# Altium footprint library Connector.PcbLib: 230 footprints (part 12 of 15)
Each footprint in its own frame and in the unit in brackets; x right, y up, seen from the top. Pads: shape width x height; smd on the part's side, far side on the other; paste and mask are expansions set on the pad; w line width, h text height; cw(c..) or ccw(c..) is an arc to the next point about the centre after c.
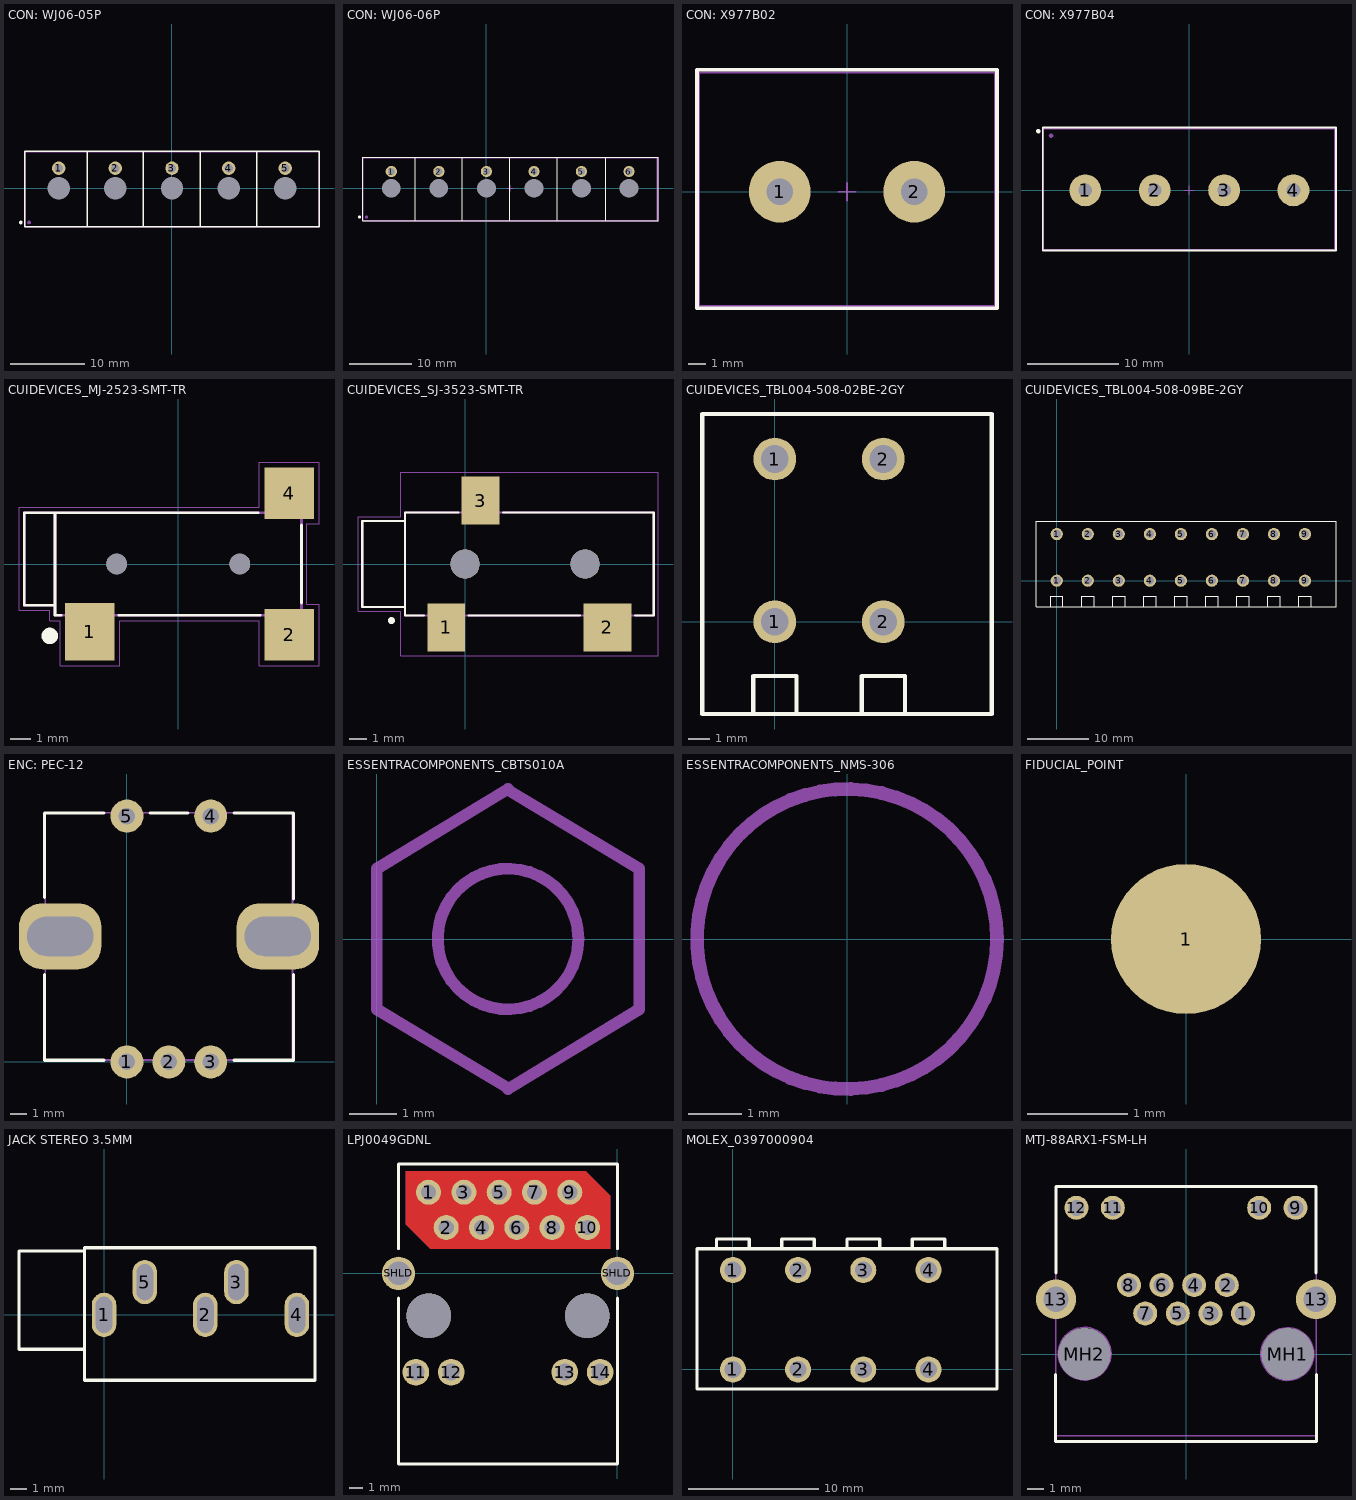
[diagram p11: the footprints below, top view; thin cyan lines are the x and y axes]

## CON: WJ06-05P [mm]
pads (12):
  round 1.8 hole 1.1: 1(-15.24,2.7) 2(-7.62,2.7) 3(0,2.7) 4(7.63,2.7) 5(15.23,2.7)
  round 0.5 on Top Overlay: ""(-20.33,-4.6)
  round 0.5 on Mech1: ""(-19.23,-4.6)
  round 2.4 hole 3: ""(-15.24,0) ""(-7.62,0) ""(0,0) ""(7.62,0) ""(15.24,0)
Top Overlay:
  lines w0.2: -11.43,-5.2 -11.43,5 ; -3.03,-5.2 -19.83,-5.2 -19.83,5 -3.03,5 ; 3.78,-5.2 3.78,5 ; 11.38,-5.2 11.38,5 ; -3.87,-5.2 19.78,-5.2 19.78,5 -3.87,5 -3.87,-5.2
TopAssy:
  lines w0.1: -19.74,-5.08 19.78,-5.08 19.78,4.92 -19.74,4.92 -19.74,-5.08
Border:
  lines w0.1: -8.12,0 -7.12,0 ; -7.62,-0.5 -7.62,0.5 ; -19.83,-5.175 -19.83,5 19.78,5 19.78,-5.175 -19.83,-5.175
3D body "Connector 5pin.STEP": height 6.12, standoff 0.04, extent -19.74,-5.08 19.74,4.972

## CON: WJ06-06P [mm]
pads (14):
  round 1.8 hole 1.1: 1(-15.24,2.7) 2(-7.62,2.7) 3(0,2.7) 4(7.63,2.7) 5(15.23,2.7) 6(22.85,2.7)
  round 0.5 on Top Overlay: ""(-20.33,-4.6)
  round 0.5 on Mech1: ""(-19.23,-4.6)
  round 2.4 hole 3: ""(-15.24,0) ""(-7.62,0) ""(0,0) ""(7.62,0) ""(15.24,0) ""(22.86,0)
Top Overlay:
  lines w0.2: -11.43,-5.2 -11.43,5 ; -3.03,-5.2 -19.83,-5.2 -19.83,5 -3.03,5 ; 3.78,-5.2 3.78,5 ; 11.38,-5.2 11.38,5 ; 19.1,-5.2 19.1,5 ; -3.87,-5.2 27.5,-5.2 27.5,5 -3.87,5 -3.87,-5.2
TopAssy:
  lines w0.1: -19.74,-5.08 27.4,-5.08 27.4,4.92 -19.74,4.92 -19.74,-5.08
Border:
  lines w0.1: 3.3,0 4.3,0 ; 3.8,-0.5 3.8,0.5 ; -19.83,-5.175 -19.83,5 27.5,5 27.5,-5.175 -19.83,-5.175
3D body "Разъем 6 выводов.STEP": height 6.17, standoff 0.17, extent -19.74,-5.08 27.36,4.92

## CON: X977B02 [mm]
pads (2):
  round 3.5 hole 1.5: 1(-3.81,0) 2(3.81,0)
Top Overlay:
  lines w0.2: -8.5,-6.6 -8.5,6.9 8.5,6.9 8.5,-6.6 -8.5,-6.6
TopAssy:
  lines w0.1: -8.37,-6.484 -8.37,6.75 8.37,6.75 8.37,-6.484 -8.37,-6.484
Border:
  lines w0.1: -0.5,0 0.5,0 ; 0,-0.5 0,0.5 ; -8.5,-6.6 -8.5,6.9 8.5,6.9 8.5,-6.6 -8.5,-6.6
3D body "User Library-DG25C-1.STEP": height 14.8, standoff -4.79, extent -8.37,-6.484 8.37,6.75

## CON: X977B04 [mm]
pads (6):
  round 3.5 hole 1.5: 1(-11.43,0) 2(-3.81,0) 3(3.81,0) 4(11.43,0)
  round 0.5 on Top Overlay: ""(-16.6,6.5)
  round 0.5 on Mech1: ""(-15.2,6)
Top Overlay:
  lines w0.2: -16.1,-6.6 16.1,-6.6 16.1,6.9 -16.1,6.9 -16.1,-6.6
TopAssy:
  lines w0.1: -15.99,6.75 15.99,6.75 15.99,-6.484 -15.99,-6.484 -15.99,6.75 ; -15.99,6.75 -15.99,6.75
Border:
  lines w0.1: -0.5,0 0.5,0 ; 0,-0.5 0,0.5 ; -16.1,-6.6 16.1,-6.6 16.1,6.85 -16.1,6.85 -16.1,-6.6
3D body "User Library-DG25C-1.STEP": height 14.8, standoff -4.79, extent -15.99,-6.484 0.75,6.75
3D body "User Library-DG25C-1.STEP": height 14.8, standoff -4.79, extent -0.75,-6.484 15.99,6.75

## CUIDEVICES_MJ-2523-SMT-TR [mm] "CONN JACK MONO 2.5MM SMD R/A"
pads (5):
  rect 2.4x2.8 smd: 1(-4.3,-3.3)
  rect 2.4x2.5 smd: 2(5.4,-3.45) 4(5.4,3.45)
  round 1 hole 1 unplated: ""(-3,0) ""(3,0)
Top Overlay:
  circle w0.4: c-6.25,-3.5 r0.2
  lines w0.127: -5.7,-2.5 -6,-2.5 -6,-2 ; -2.9,-2.5 4,-2.5 ; 3.9,2.5 -6,2.5 ; 6,-1.9 6,1.9 ; -6,-2 -7.5,-2 -7.5,2.5 -6,2.5 ; -6,-2 -6,2.5
Border:
  lines w0.05: -7.75,-2.25 -6.25,-2.25 -6.25,-2.75 -5.75,-2.75 -5.75,-4.95 -2.85,-4.95 -2.85,-2.75 3.95,-2.75 3.95,-4.95 6.85,-4.95 6.85,-1.95 6.25,-1.95 6.25,1.95 6.85,1.95 6.85,4.95 3.95,4.95 3.95,2.75 -7.75,2.75 -7.75,-2.25
3D:
  circle w0.4: c-4.5,-4 r0.2
  lines w0.127: -6,-2 -7.5,-2 -7.5,2.5 -6,2.5 ; -6,-2 -6,-2.5 6,-2.5 6,2.5 -6,2.5 ; -6,-2 -6,2.5
3D body "CUI_DEVICES_MJ-2523-SMT-TR.step": height 4.7, standoff -0.6, extent -7.5,-3.75 6,4.25

## CUIDEVICES_SJ-3523-SMT-TR [mm] "CONN JACK STEREO 3.5MM SMD R/A"
pads (5):
  rect 2.2x2.8 smd: 1(-1.1,-3.7) 3(0.9,3.7)
  rect 2.8x2.8 smd: 2(8.3,-3.7)
  round 1.7 hole 1.7 unplated: ""(0,0) ""(7,0)
Top Overlay:
  circle w0.2: c-4.3,-3.3 r0.1
  lines w0.127: -2.4,-3 -3.5,-3 -3.5,-2.5 ; -0.4,3 -3.5,3 -3.5,2.5 ; 0.2,-3 6.7,-3 ; 2.2,3 11,3 11,-3 9.9,-3 ; -3.5,-2.5 -6,-2.5 -6,2.5 -3.5,2.5 ; -3.5,-2.5 -3.5,2.5
Border:
  lines w0.05: -6.25,-2.75 -6.25,2.75 -3.75,2.75 -3.75,5.35 11.25,5.35 11.25,-5.35 -3.75,-5.35 -3.75,-2.75 -6.25,-2.75
3D:
  circle w0.2: c-4.3,-3.3 r0.1
  lines w0.127: -3.5,-2.5 -6,-2.5 -6,2.5 -3.5,2.5 ; -3.5,-3 11,-3 11,3 -3.5,3 -3.5,-3
3D body "CUI_DEVICES_SJ-3523-SMT-TR.step": height 5, standoff -0.8, extent -5.96,-4.555 11.04,4.445

## CUIDEVICES_TBL004-508-02BE-2GY [mm] "TERMINAL BLOCK, SCREWLESS, 5.08"
pads (4):
  round 2 hole 1.3: 1(0,0) 1(0,7.62) 2(5.08,0) 2(5.08,7.62)
Top Overlay:
  lines w0.2: -1.016,-4.267 -1.016,-2.54 1.016,-2.54 1.016,-4.267 ; 4.064,-4.267 4.064,-2.54 6.096,-2.54 6.096,-4.267 ; 10.16,-4.318 -3.404,-4.318 -3.404,-1.524 -3.404,0 -3.404,9.144 -3.404,9.728 -3.378,9.728 0,9.728 10.16,9.728 ; 10.16,-4.267 10.16,9.652
3D body "gorizont.STEP": height 12.6, standoff -3.6, extent -3.14,-4.1 1.94,9.5
3D body "gorizont.STEP": height 12.6, standoff -3.6, extent 2.02,-4.1 7.1,9.5

## CUIDEVICES_TBL004-508-09BE-2GY [mm] "TERMINAL BLOCK, SCREWLESS, 5.08"
pads (18):
  round 2 hole 1.3: 1(0,0) 1(0,7.62) 2(5.08,0) 2(5.08,7.62) 3(10.16,0) 3(10.16,7.62) 4(15.24,0) 4(15.24,7.62) 5(20.32,0) 5(20.32,7.62) 6(25.4,0) 6(25.4,7.62) 7(30.48,0) 7(30.48,7.62) 8(35.56,0) 8(35.56,7.62) 9(40.64,0) 9(40.64,7.62)
Top Overlay:
  lines w0.2: -1.016,-4.267 -1.016,-2.54 1.016,-2.54 1.016,-4.267 ; 4.064,-4.267 4.064,-2.54 6.096,-2.54 6.096,-4.267 ; 9.144,-4.267 9.144,-2.54 11.176,-2.54 11.176,-4.267 ; 14.224,-4.267 14.224,-2.54 16.256,-2.54 16.256,-4.267 ; 19.304,-4.267 19.304,-2.54 21.336,-2.54 21.336,-4.267 ; 24.384,-4.267 24.384,-2.54 26.416,-2.54 26.416,-4.267 ; 29.464,-4.267 29.464,-2.54 31.496,-2.54 31.496,-4.267 ; 34.544,-4.267 34.544,-2.54 36.576,-2.54 36.576,-4.267 ; 39.624,-4.267 39.624,-2.54 41.656,-2.54 41.656,-4.267 ; 45.72,-1.524 45.72,9.144 45.72,9.728 ; 45.72,9.728 45.72,-4.267 42.24,-4.267 -3.404,-4.267 -3.404,-1.524 -3.404,0 -3.404,9.144 -3.404,9.728 -3.378,9.728 0,9.728 45.72,9.728
3D body: height 13.3, standoff 10.4, extent 1.25,-1.13 2.25,8.12
3D body: height 13.3, standoff 10.4, extent -2.5,-5.13 2.25,4.12
3D body: height 13.3, standoff 10.4, extent 6.33,-1.13 7.33,8.12
3D body: height 13.3, standoff 10.4, extent 2.58,-5.13 7.33,4.12
3D body: height 13.3, standoff 10.4, extent 11.41,-1.13 12.41,8.12
3D body: height 13.3, standoff 10.4, extent 7.66,-5.13 12.41,4.12
3D body: height 13.3, standoff 10.4, extent 16.49,-1.13 17.49,8.12
3D body: height 13.3, standoff 10.4, extent 12.74,-5.13 17.49,4.12
3D body: height 13.3, standoff 10.4, extent 21.57,-1.13 22.57,8.12
3D body: height 13.3, standoff 10.4, extent 17.82,-5.13 22.57,4.12
3D body: height 13.3, standoff 10.4, extent 26.65,-1.13 27.65,8.12
3D body: height 13.3, standoff 10.4, extent 22.9,-5.13 27.65,4.12
3D body: height 13.3, standoff 10.4, extent 31.73,-1.13 32.73,8.12
3D body: height 13.3, standoff 10.4, extent 27.98,-5.13 32.73,4.12
3D body: height 13.3, standoff 10.4, extent 36.81,-1.13 37.81,8.12
3D body: height 13.3, standoff 10.4, extent 33.06,-5.13 37.81,4.12
3D body: height 13.3, standoff 10.4, extent 41.89,-1.13 42.89,8.12
3D body: height 13.3, standoff 10.4, extent 38.14,-5.13 42.89,4.12
3D body: height 10.4, standoff 0, extent -3.4,-4.3 45.7,9.7

## ENC: PEC-12 [mm]
pads (7):
  round 2 hole 1: 1(0,0) 2(2.54,0) 3(5.08,0) 4(5.08,14.922) 5(0,14.922)
  rrect70% 5x4 hole 2.4 slot 4 at 0 deg: ""(-4.05,7.625) ""(9.15,7.625)
Top Overlay:
  lines w0.2: -5,5.3 -5,0.1 -1.4,0.1 ; -5,10 -5,15.1 -1.4,15.1 ; 1.4,15.1 3.7,15.1 ; 6.5,0.1 10.1,0.1 10.1,5.3 ; 6.5,15.1 10.1,15.1 10.1,9.9
TopAssy:
  lines w0.1: -4.966,0.12 -4.966,15.12 10.046,15.12 10.046,0.12 -4.966,0.12
3D body "User Library-rotacijski enkoder.STEP": height 16.5, standoff -4.53, extent -4.964,0.12 10.044,15.12

## ESSENTRACOMPONENTS_CBTS010A [mm] "HEX STANDOFF M3 NYLON 5MM"
3D:
  circle w0.254: c2.8,0 r1.5
  lines w0.254: 2.8,-3.2 5.6,-1.5 5.6,0 5.6,1.5 2.8,3.176 ; 2.8,-3.176 0,-1.5 0,0 0,1.5 2.8,3.2
3D body: height 0.25, standoff -173.75, extent 0,1.5 0,1.5
3D body: height 5, standoff 0, extent 0,-3.2 5.6,3.2

## ESSENTRACOMPONENTS_NMS-306 [mm] "MACH SCREW PAN HEAD PHILLIPS M3"
height 2.5
3D:
  circle w0.254: c0,0 r2.8
3D body "NMS-306.stp": height 2.5, standoff -6.4, extent -2.85,-2.85 2.85,2.85

## FIDUCIAL_POINT [mm]
pads (1):
  round 1.5 all layers, no hole paste+3 mask+1: 1(0,0)
Multi-Layer:
  circle w0.254: c0,0 r1.5

## JACK STEREO 3.5MM [mm]
height 12.3
pads (5):
  oval 1.5x2.7 hole 2.2 slot 1 at 0 deg: 1(0,0) 2(6.2,0) 3(8.1,2) 4(11.8,0) 5(2.5,2)
Top Overlay:
  lines w0.2: -1.2,-2.1 -5.2,-2.1 -5.2,3.9 -1.2,3.9 ; -1.2,-4 -1.2,4.1 12.9,4.1 12.9,-4 -1.2,-4
3D body "User Library-ST-215N-03.STEP": height 12.3, standoff -3.5, extent -5.325,-4 12.775,4.1

## LPJ0049GDNL [mm]
height 13.3
pads (16):
  round 1.8 hole 1.1: 1(-13.59,5.842) 2(-12.32,3.302) 3(-11.05,5.842) 4(-9.78,3.302) 5(-8.51,5.842) 6(-7.24,3.302) 7(-5.97,5.842) 8(-4.7,3.302) 9(-3.43,5.842) 10(-2.16,3.302)
  round 1.92 hole 1.22: 11(-14.505,-7.108) 12(-11.965,-7.108) 13(-3.785,-7.108) 14(-1.245,-7.108)
  round 2.4 hole 1.7: SHLD(-15.75,0) SHLD(0,0)
via -2.16,-3.048 diameter 3.2 hole 3.2
via -13.59,-3.048 diameter 3.2 hole 3.2
Top Layer:
  pour cut-out: -15.24,7.366 -15.24,3.556 -13.462,1.778 -0.508,1.778 -0.508,5.588 -2.286,7.366
Bottom Layer:
  pour cut-out: -15.24,7.366 -15.24,3.556 -13.462,1.778 -0.508,1.778 -0.508,5.588 -2.286,7.366
Top Overlay:
  lines w0.2: -15.748,1.778 -15.75,5.143 -15.75,7.874 -4.954,7.874 0,7.874 0,1.778 ; -10.542,-13.716 -15.75,-13.716 ; 0,-8.319 0,-13.716 ; 0,-1.778 0,-13.716 ; -15.75,-13.716 0,-13.716 ; -15.75,-13.716 -15.748,-1.778 -15.75,-13.716
3D body: height 13, standoff 0, extent -15.75,-13.716 0,7.874

## MOLEX_0397000904 [mm] "TERM BLK 4POS TOP ENTRY 5MM PCB"
pads (8):
  round 2 hole 1.3: 1(0,0) 1(0,7.62) 2(5,0) 2(5,7.62) 3(10,0) 3(10,7.62) 4(15,0) 4(15,7.62)
Top Overlay:
  lines w0.254: -1.25,9.25 -1.25,10 1.25,10 1.25,9.25 ; 3.75,9.25 3.75,10 6.25,10 6.25,9.25 ; 8.75,9.25 8.75,10 11.25,10 11.25,9.25 ; 13.75,9.25 13.75,10 16.25,10 16.25,9.25 ; -2.75,-1.5 20.25,-1.5 20.25,9.25 -2.75,9.25 -2.75,-1.5
3D body: height 14, standoff 7, extent 13.75,8.5 16.25,10
3D body: height 14, standoff 7, extent 8.75,8.5 11.25,10
3D body: height 14, standoff 7, extent 3.75,8.5 6.25,10
3D body: height 14, standoff 7, extent -1.25,8.5 1.25,10
3D body: height 14, standoff 0, extent -2.5,-1.25 20,9

## MTJ-88ARX1-FSM-LH [mm]
pads (16):
  round 1.5 hole 1 mask+0.05: 1(3.57,2.54) 2(2.55,4.32) 3(1.53,2.54) 4(0.51,4.32) 5(-0.51,2.54) 6(-1.53,4.32) 7(-2.55,2.54) 8(-3.57,4.32) 9(6.85,9.15) 10(4.575,9.15) 11(-4.575,9.15) 12(-6.85,9.15)
  round 2.5 hole 1.57 mask+0.05: 13(-8.13,3.43) 13(8.13,3.43)
  round 3.25 hole 3.25 unplated mask+0.05: MH1(6.35,0) MH2(-6.35,0)
Top Overlay:
  lines w0.2: -8.155,-1.27 -8.155,-5.46 8.155,-5.46 8.155,-1.27 ; -8.13,5.08 -8.13,10.475 8.13,10.475 8.13,5.08
Border:
  lines w0.1: -8.155,-5.1 -8.155,10.475 8.155,10.475 8.155,-5.1 -8.155,-5.1
3D:
  circle w0.1: c6.34,0 r1.652
  circle w0.1: c-6.34,0.025 r1.652
3D body "c-406549-1-r-3d.stp": height 14.8, standoff -3.92, extent -9.371,-6.223 9.272,10.498